# Altium footprint library PCBLIB.PcbLib: 775 footprints (part 11 of 49)
Each footprint in its own frame and in the unit in brackets; x right, y up, seen from the top. Pads: shape width x height; smd on the part's side, far side on the other; paste and mask are expansions set on the pad; w line width, h text height; cw(c..) or ccw(c..) is an arc to the next point about the centre after c.
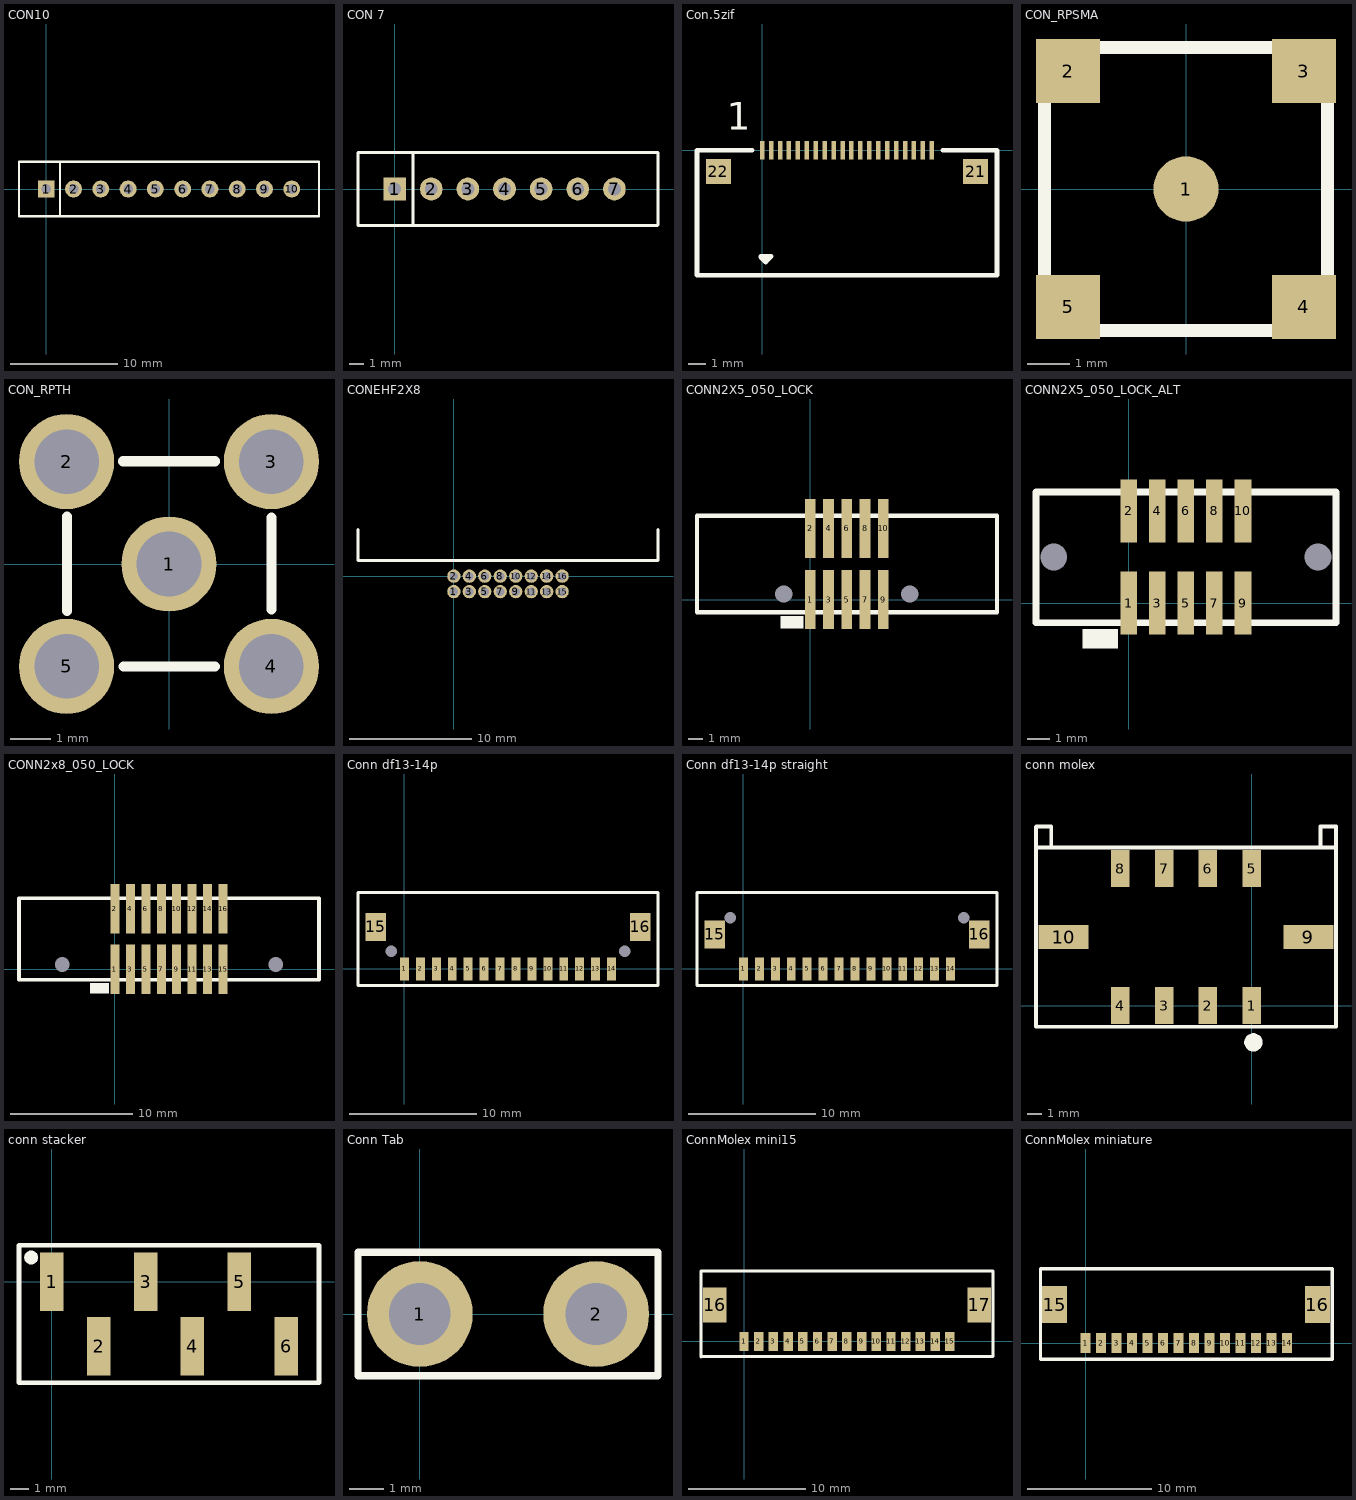
[diagram p10: the footprints below, top view; thin cyan lines are the x and y axes]

## CON10 [mil]
height 250
pads (10):
  rect 62x62 hole 35: 1(0,0)
  round 62 hole 35: 2(100,0) 3(200,0) 4(300,0) 5(400,0) 6(500,0) 7(600,0) 8(700,0) 9(800,0) 10(900,0)
TopOverlay:
  lines w8: 50,-100 50,100 ; -100,-100 1000,-100 1000,100 -100,100 -100,-100
Mechanical4:
  text ".300" at 0,0 h1
  text ".358" at 0,-1 h1

## CON 7 [mil]
pads (7):
  rect 62x62 hole 35: 1(0,0)
  round 62 hole 35: 2(100,0) 3(200,0) 4(300,0) 5(400,0) 6(500,0) 7(600,0)
TopOverlay:
  lines w8: 50,-100 50,100 ; 484.88,-100 717.68,-100 719.07,-98.61 719.07,100 500,100 -100,100 -100,-100 500,-100
Mechanical4:
  text ".300" at 0,0 h1
  text ".358" at 0,-1 h1

## Con.5zif [mm]
pads (22):
  rect 0.25x1.016 smd: 1(0,0) 2(0.5,0) 3(1,0) 4(1.5,0) 5(2,0) 6(2.5,0) 7(3,0) 8(3.5,0) 9(4,0) 10(4.5,0) 11(5,0) 12(5.5,0) 13(6,0) 14(6.5,0) 15(7,0) 16(7.5,0) 17(8,0) 18(8.5,0) 19(9,0) 20(9.5,0)
  rect 1.4x1.4 smd: 21(11.95,-1.2) 22(-2.45,-1.2)
TopOverlay:
  lines w0.254: -0.559,0 -3.65,0 -3.65,-7 13.15,-7 13.15,0 10.109,0 ; -0.076,-5.994 0.203,-6.274 0.203,-6.248 0.508,-5.944 -0.076,-5.944
  text "1" at -1.981,1.143 h1.52
Mechanical4:
  text ".031" at 0,0 h0.03

## CON_RPSMA [mil] "Surface Mount Antenna Connector"
height 417
pads (5):
  round 60 smd: 1(0,0)
  rect 59x59 smd: 2(-108.5,108.5) 3(108.5,108.5) 4(108.5,-108.5) 5(-108.5,-108.5)
TopOverlay:
  lines w12: -130,-130 130,-130 130,130 -130,130 -130,-130

## CON_RPTH [mil]
pads (5):
  round 93 hole 63: 1(0,0) 2(-100,100) 3(100,100) 4(100,-100) 5(-100,-100)
TopOverlay:
  lines w10: -99.73,-45.91 -99.73,46.05 ; -44.98,100.27 44.85,100.27 ; -44.45,-100.13 44.85,-100.13 ; 100.13,-44.32 100.13,45.52

## CONEHF2X8 [mil]
pads (16):
  round 43 hole 28: 1(0,-50) 2(0,0) 3(50,-50) 4(50,0) 5(100,-50) 6(100,0) 7(150,-50) 8(150,0) 9(200,-50) 10(200,0) 11(250,-50) 12(250,0) 13(300,-50) 14(300,0) 15(350,-50) 16(350,0)
TopOverlay:
  lines w10: -310,150 -310,50 660,50 660,150

## CONN2X5_050_LOCK [mil]
pads (12):
  round 1 hole 47: 0(-72.5,15) 0(272.5,15)
  rect 29x161 smd: 1(0,0) 2(0,195) 3(50,0) 4(50,195) 5(100,0) 6(100,195) 7(150,0) 8(150,195) 9(200,0) 10(200,195)
TopOverlay:
  rectangle: -80.8,-79.39 -18.55,-45.2
  lines w12: -310,-34.5 -310,229.5 511.22,229.5 511.22,-34.5 -310,-34.5

## CONN2X5_050_LOCK_ALT [mil]
pads (12):
  round 1 hole 47: 0(-131,80.5) 0(331,80.5)
  rect 29x110 smd: 1(0,0) 2(0,161) 3(50,0) 4(50,161) 5(100,0) 6(100,161) 7(150,0) 8(150,161) 9(200,0) 10(200,161)
TopOverlay:
  rectangle: -80.8,-79.39 -18.55,-45.2
  lines w12: -161.99,-34.5 362.67,-34.5 362.67,194.3 -161.99,194.3 -161.99,-34.5

## CONN2x8_050_LOCK [mil]
height 325
pads (18):
  round 1 hole 47: 0(-170,15) 0(520,15)
  rect 29x161 smd: 1(0,0) 2(0,195) 3(50,0) 4(50,195) 5(100,0) 6(100,195) 7(150,0) 8(150,195) 9(200,0) 10(200,195) 11(250,0) 12(250,195) 13(300,0) 14(300,195) 15(350,0) 16(350,195)
TopOverlay:
  rectangle: -80.8,-79.39 -18.55,-45.2
  lines w12: -310,-34.5 -310,229.5 660,229.5 660,-34.5 -310,-34.5

## Conn df13-14p [mm]
pads (18):
  rect 0.7x1.8 smd: 1(0,0) 2(1.25,0) 3(2.5,0) 4(3.75,0) 5(5,0) 6(6.25,0) 7(7.5,0) 8(8.75,0) 9(10,0) 10(11.25,0) 11(12.5,0) 12(13.75,0) 13(15,0) 14(16.25,0)
  rect 1.6x2.2 smd: 15(-2.25,3.289) 16(18.5,3.289)
  round 0 hole 0.9: ""(-1.05,1.389) ""(17.3,1.397)
TopOverlay:
  lines w0.254: -3.65,-1.3 19.9,-1.3 19.9,5.989 -3.65,5.989 -3.65,-1.3

## Conn df13-14p straight [mm]
pads (18):
  rect 0.7x1.8 smd: 1(0,0) 2(1.25,0) 3(2.5,0) 4(3.75,0) 5(5,0) 6(6.25,0) 7(7.5,0) 8(8.75,0) 9(10,0) 10(11.25,0) 11(12.5,0) 12(13.75,0) 13(15,0) 14(16.25,0)
  rect 1.6x2.2 smd: 15(-2.25,2.7) 16(18.5,2.7)
  round 0 hole 0.9: ""(-1.05,4) ""(17.3,4)
TopOverlay:
  lines w0.254: -3.65,-1.3 -3.65,5.989 19.9,5.989 19.9,-1.3 -3.65,-1.3

## conn molex [mil]
pads (11):
  rect 50x100 smd: 1(0,0) 2(-118,0) 3(-236,0) 4(-354,0) 5(0,370) 6(-118,370) 7(-236,370) 8(-354,370)
  rect 135x65 smd: 9(153.5,185) 10(-507.5,185)
  round 50 on Top Overlay: ""(5,-99)
TopOverlay:
  lines w10: -544,427 -541,430 -541,484 -581,484 -582,483 -582,427 ; 185,427 186,428 186,484 228,484 228,427 ; -582,427 -351,427 228,427 ; -582,427 -582,177 -582,-57 -350,-57 149,-57 228,-57 228,192 228,427
Mechanical4:
  text ".150" at 0,0 h1

## conn stacker [mil]
pads (7):
  rect 50x125 smd: 1(0,0) 2(100,-137) 3(200,0) 4(300,-137) 5(400,0) 6(500,-137)
  round 30 on Top Overlay: ""(-44,52)
TopOverlay:
  lines w10: -70,-215 570,-215 570,78 -70,78 -70,-215

## Conn Tab [mil] "HV Connecting Tab Male"
height 370
pads (2):
  round 120 hole 70: 1(0,0) 2(200,0)
TopOverlay:
  lines w8: -70,-70 -70,70 270,70 270,-70 -70,-70
Mechanical4:
  text ".341" at 0,0 h1

## ConnMolex mini15 [mm]
pads (17):
  rect 0.8x1.6 smd: 1(0,0) 2(1.25,0) 3(2.5,0) 4(3.75,0) 5(5,0) 6(6.25,0) 7(7.5,0) 8(8.75,0) 9(10,0) 10(11.25,0) 11(12.5,0) 12(13.75,0) 13(15,0) 14(16.25,0) 15(17.5,0)
  rect 2x3 smd: 16(-2.5,3.1) 17(20.015,3.1)
TopOverlay:
  lines w0.254: -3.658,-1.321 -3.658,5.968 ; -3.65,-1.3 21.195,-1.3 21.195,5.989 -3.65,5.989

## ConnMolex miniature [mm]
pads (16):
  rect 0.8x1.6 smd: 1(0,0) 2(1.25,0) 3(2.5,0) 4(3.75,0) 5(5,0) 6(6.25,0) 7(7.5,0) 8(8.75,0) 9(10,0) 10(11.25,0) 11(12.5,0) 12(13.75,0) 13(15,0) 14(16.25,0)
  rect 2x3 smd: 15(-2.5,3.1) 16(18.7,3.1)
TopOverlay:
  lines w0.254: -3.65,-1.3 -3.65,5.989 19.9,5.989 19.9,-1.3 -3.65,-1.3